# Altium footprint library Belle_library.PcbLib: 59 footprints (part 3 of 4)
Each footprint in its own frame and in the unit in brackets; x right, y up, seen from the top. Pads: shape width x height; smd on the part's side, far side on the other; paste and mask are expansions set on the pad; w line width, h text height; cw(c..) or ccw(c..) is an arc to the next point about the centre after c.
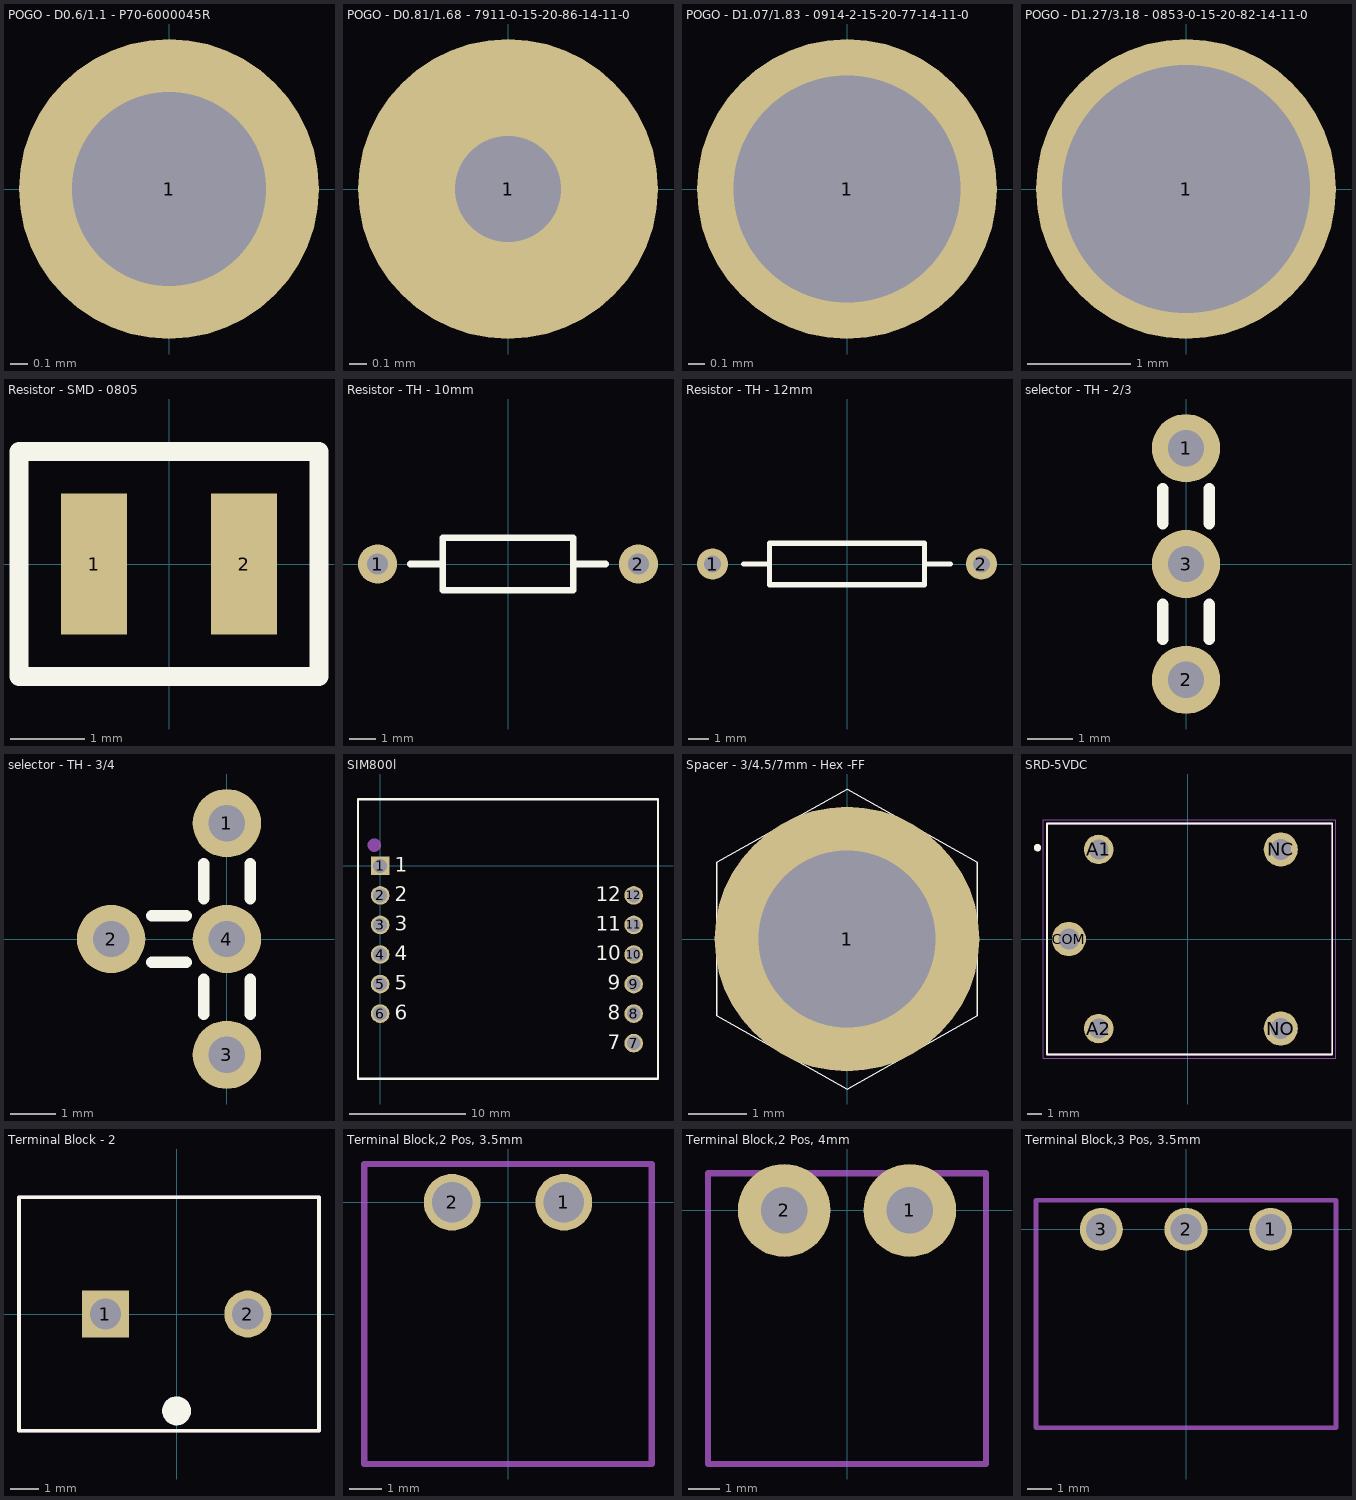
[diagram p2: the footprints below, top view; thin cyan lines are the x and y axes]

## POGO - D0.6/1.1 - P70-6000045R [mm]
pads (1):
  round 1.7 hole 1.1 paste+0 mask+0: 1(0,0)
3D body "p70-6000045.stp": height 2.8, standoff -0.65, extent -0.75,-0.75 0.75,0.75

## POGO - D0.81/1.68 - 7911-0-15-20-86-14-11-0 [mm]
pads (1):
  round 1.7 hole 0.6 paste+0 mask+0: 1(0,0)
3D body "mill-max-7911-0-15-20-86-14-11-0.STEP": height 7.51, standoff -3.18, extent -0.835,-0.835 0.835,0.835

## POGO - D1.07/1.83 - 0914-2-15-20-77-14-11-0 [mm]
pads (1):
  round 1.85 hole 1.397 paste+0 mask+0: 1(0,0)
3D body "mill-max-0914-0-15-20-77-14-11-0.STEP": height 7.01, standoff -3.58, extent -0.914,-0.914 0.915,0.915

## POGO - D1.27/3.18 - 0853-0-15-20-82-14-11-0 [mm]
pads (1):
  round 2.9 hole 2.4 paste+0 mask+0: 1(0,0)
3D body "mill-max-0853-0-15-20-82-14-11-0.STEP": height 8.1, standoff -1.5, extent -1.587,-1.587 1.588,1.588

## Resistor - SMD - 0805 [mil] "SMD resistor - 0805"
pads (2):
  rect 35x75 smd: 1(-40,0) 2(40,0)
Top Overlay:
  lines w10: -80,-60 80,-60 80,60 -80,60 -80,-60
3D body "R0805.step": height 19.68, standoff 0, extent -39.36,-24.6 39.38,24.61

## Resistor - TH - 10mm [mm] "Through-hole resistor 10mm/0.8mm"
pads (2):
  round 1.5 hole 0.8: 1(-5,0) 2(5,0)
Top Overlay:
  lines w0.254: -3.75,0 -2.5,0 ; 3.75,0 2.5,0 ; -2.5,0 -2.5,-1 2.5,-1 2.5,0 ; -2.5,0 -2.5,1 2.5,1 2.5,0
3D body "RES_AL_060W_500P.STEP": height 3.9, standoff -1.3, extent -6.55,-1.2 6.55,1.2

## Resistor - TH - 12mm [mm] "Through-hole resistor 12mm/0.8mm"
pads (2):
  round 1.5 hole 0.8: 1(-6.5,0) 2(6.5,0)
Top Overlay:
  lines w0.254: -5,0 -3.75,0 ; 3.75,0 5,0 ; -3.75,0 -3.75,1 3.75,1 3.75,-1 -3.75,-1 -3.75,0
3D body "RES_AL_060W_500P.STEP": height 3.9, standoff -1.3, extent -6.55,-1.2 6.55,1.2

## selector - TH - 2/3 [mm] "selector - 2 inputs/1 output - through-hole"
pads (3):
  round 1.5 hole 0.8: 1(0,2.54) 2(0,-2.54) 3(0,0)
Top Overlay:
  lines w0.254: -0.508,-1.651 -0.508,-0.889 ; -0.508,0.889 -0.508,1.651 ; 0.508,-1.651 0.508,-0.889 ; 0.508,0.889 0.508,1.651

## selector - TH - 3/4 [mm] "selector - 3 inputs/1 output - through-hole"
pads (4):
  round 1.5 hole 0.8: 1(0,2.54) 2(-2.54,0) 3(0,-2.54) 4(0,0)
Top Overlay:
  lines w0.254: -1.651,-0.508 -0.889,-0.508 ; -1.651,0.508 -0.889,0.508 ; -0.508,-1.651 -0.508,-0.889 ; -0.508,0.889 -0.508,1.651 ; 0.508,-1.651 0.508,-0.889 ; 0.508,0.889 0.508,1.651

## SIM800l [mm]
pads (12):
  rect 1.6x1.6 hole 1.2: 1(0,0)
  round 1.6 hole 1.2: 2(0,-2.54) 3(0,-5.08) 4(0,-7.62) 5(0,-10.16) 6(0,-12.7) 7(21.792,-15.24) 8(21.792,-12.7) 9(21.792,-10.16) 10(21.792,-7.62) 11(21.792,-5.08) 12(21.792,-2.54)
Top Overlay:
  lines w0.2: -1.905,-18.288 -1.905,5.715 23.876,5.715 23.876,-18.288 -1.905,-18.288
  text "1" at 1.27,-0.508 h1.27
  text "2" at 1.27,-3.048 h1.27
  text "3" at 1.27,-5.588 h1.27
  text "4" at 1.27,-8.128 h1.27
  text "5" at 1.27,-10.668 h1.27
  text "6" at 1.27,-13.208 h1.27
  text "7" at 19.558,-15.748 h1.27
  text "8" at 19.558,-13.208 h1.27
  text "9" at 19.558,-10.668 h1.27
  text "10" at 18.542,-8.128 h1.27
  text "11" at 18.542,-5.588 h1.27
  text "12" at 18.542,-3.048 h1.27
Mechanical 13:
  circle w0.635: c-0.508,1.778 r0.254
3D body "module_sim800l.STEP": height 7.16, standoff -5.34, extent -1.53,-17.917 23.47,5.217

## Spacer - 3/4.5/7mm - Hex -FF [mil]
pads (1):
  round 180 hole 120 paste+0 mask+0: 1(0,0)
Top Overlay:
  circle w1: c0,0 r59.06
  circle w1: c0,0 r88.58
  lines w0.98: -88.58,-52.17 0,-101.98 88.58,-52.17 88.58,52.17 0,101.98 -88.58,52.17 -88.58,-52.17
3D body "M1254-3005-AL.stp": height 275.59, standoff 0, extent -88.58,-101.98 88.58,101.98

## SRD-5VDC [mm]
pads (5):
  round 1.98 hole 1.32: A1(-5.973,6) A2(-5.973,-6)
  round 2.286 hole 1.397: COM(-7.973,0) NC(6.227,6) NO(6.227,-6)
Top Overlay:
  circle w0.3: c-10.073,6.119 r0.1
  lines w0.127: -9.423,-7.75 9.677,-7.75 9.677,7.75 -9.423,7.75 -9.423,-7.75
Mechanical 13:
  lines w0.127: -9.423,-7.75 9.677,-7.75 9.677,7.75 -9.423,7.75 -9.423,-7.75
Mechanical 15:
  lines w0.05: -9.673,-8 9.927,-8 9.927,8 -9.673,8 -9.673,-8
3D body "Relay-SRD-05VDC.STEP": height 15.41, standoff -4.89, extent -9.396,-7.712 9.704,7.788

## Terminal Block - 2 [mm]
pads (2):
  rect 1.65x1.65 hole 1.1: 1(-2.5,0)
  round 1.65 hole 1.1: 2(2.5,0)
Top Overlay:
  circle w0.508: c0,-3.404 r0.254
  lines w0.127: -5.537,-4.1 5,-4.1 5,4.1 -5.537,4.1 -5.537,-4.1
Mechanical 13:
  circle w0.2: c-2.5,0 r0.1
  lines w0.127: -5.537,-4.1 5,-4.1 5,4.1 -5.537,4.1 -5.537,-4.1
3D body "terminal block - 2.stp": height 10.01, standoff -3.49, extent -5.579,-4.085 5.021,4.115

## Terminal Block,2 Pos, 3.5mm [mil] "Terminal Block,2 Pos, 3.5mm"
pads (2):
  round 70 hole 50 paste+0 mask+0: 1(68.9,0) 2(-68.9,0)
Mechanical 1:
  lines w7.8: -177.17,-322.83 -177.17,47.24 177.17,47.24 177.17,-322.83 -177.17,-322.83
3D body "PCB Terminal Blocks, Plug, Wire-to-Board, 2 Position, 3.5mm-F.stp": height 324.8, standoff -94.49, extent -177.16,-314.96 177.17,47.24
3D body "PCB Terminal Blocks, Plug, Wire-to-Board, 2 Position, 3.5mm-M.stp": height 346.46, standoff -90.55, extent -137.8,-663.39 137.8,-53.15

## Terminal Block,2 Pos, 4mm [mm] "Terminal Block,2 Pos, 4mm"
pads (2):
  round 3 hole 1.5 paste+0 mask+0: 1(2.032,0) 2(-2.032,0)
Mechanical 1:
  lines w0.198: -4.5,-8.2 4.5,-8.2 4.5,1.2 -4.5,1.2 -4.5,-8.2
3D body "PCB Terminal Blocks, Plug, Wire-to-Board, 2 Position, 3.5mm-M.stp": height 8.8, standoff -2.3, extent -3.5,-16.85 3.5,-1.35
3D body "PCB Terminal Blocks, Plug, Wire-to-Board, 2 Position, 3.5mm-F.stp": height 8.25, standoff -2.4, extent -4.5,-8 4.5,1.2

## Terminal Block,3 Pos, 3.5mm [mil] "Terminal Block,3 Pos, 3.5mm"
pads (3):
  round 70 hole 50 paste+0 mask+0: 1(137.8,0) 2(0,0) 3(-137.8,0)
Mechanical 1:
  lines w7.8: -244.09,-322.83 -244.09,47.24 244.09,47.24 244.09,-322.83 -244.09,-322.83
3D body "PCB Terminal Blocks, Plug, Wire-to-Board, 3 Position, 3.5mm-F.stp": height 324.8, standoff -94.49, extent -246.06,-314.96 246.06,47.24
3D body "PCB Terminal Blocks, Plug, Wire-to-Board, 3 Position, 3.5mm-M.stp": height 346.46, standoff -90.55, extent -206.69,-669.29 206.69,-59.05